# Altium footprint library connectors_socets.pcblib: 601 footprints (part 8 of 38)
Each footprint in its own frame and in the unit in brackets; x right, y up, seen from the top. Pads: shape width x height; smd on the part's side, far side on the other; paste and mask are expansions set on the pad; w line width, h text height; cw(c..) or ccw(c..) is an arc to the next point about the centre after c.
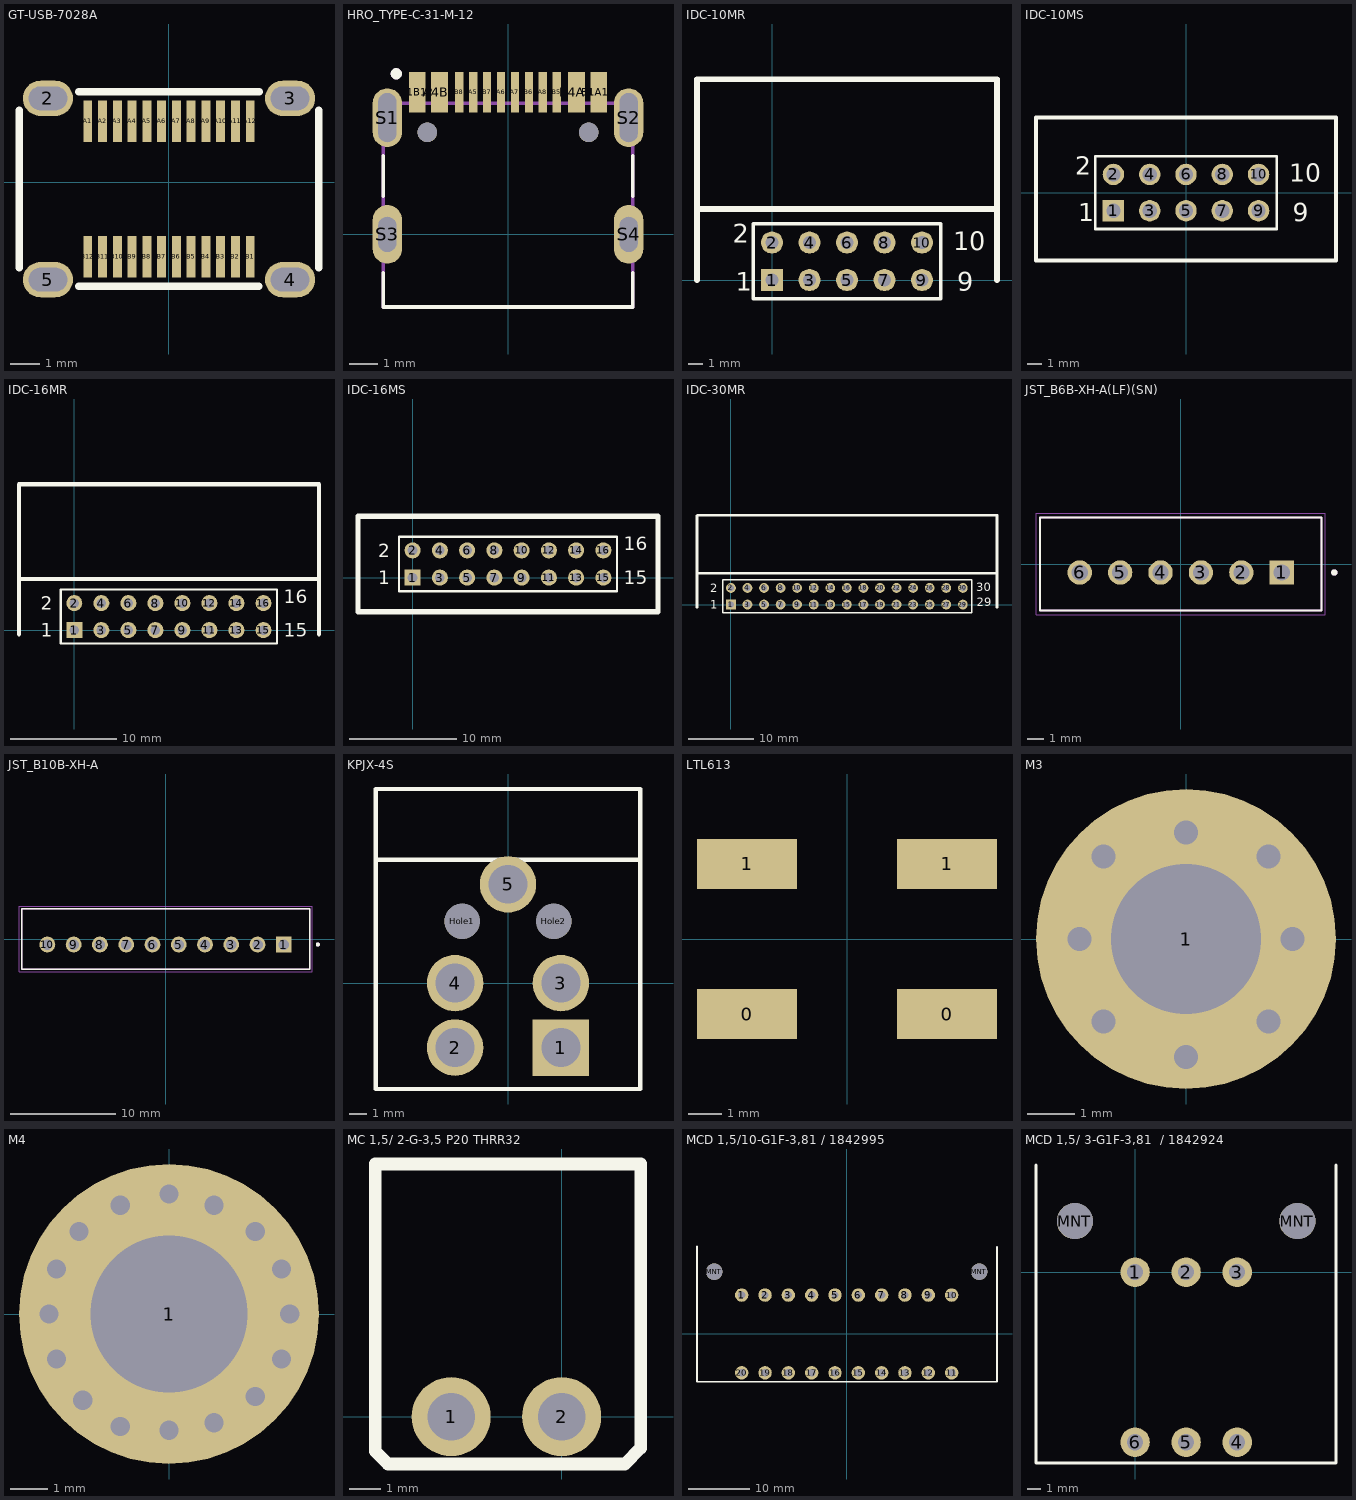
[diagram p7: the footprints below, top view; thin cyan lines are the x and y axes]

## GT-USB-7028A [mm] "USB C Vertical"
pads (28):
  oval 1.7x1.2 hole 0.8 slot 1.3 at 0 deg paste-2539.97 mask+0.05: 2(-4.1,2.84) 3(4.1,2.84) 4(4.1,-3.3) 5(-4.1,-3.3)
  rect 0.3x1.4 smd paste-100 mask+0.05: A1(-2.75,2.07) A2(-2.25,2.07) A3(-1.75,2.07) A4(-1.25,2.07) A5(-0.75,2.07) A6(-0.25,2.07) A7(0.25,2.07) A8(0.75,2.07) A9(1.25,2.07) A10(1.75,2.07) A11(2.25,2.07) A12(2.75,2.07) B1(2.75,-2.53) B2(2.25,-2.53) B3(1.75,-2.53) B4(1.25,-2.53) B5(0.75,-2.53) B6(0.25,-2.53) B7(-0.25,-2.53) B8(-0.75,-2.53) B9(-1.25,-2.53) B10(-1.75,-2.53) B11(-2.25,-2.53) B12(-2.75,-2.53)
Top Overlay:
  lines w0.254: -5.08,-2.897 -5.08,2.437 ; -3.052,-3.532 3.048,-3.532 ; -3.052,3.072 3.052,3.072 ; 5.08,-2.905 5.08,2.437
Top Paste:
  drawing of 28 lines, arcs and shapes, not listed
3D body "GT-USB-7028A.stp": height 12.06, standoff -1.64, extent -5.5,-3.725 5.5,3.275

## HRO_TYPE-C-31-M-12 [mm]
pads (18):
  rect 0.6x1.45 smd: A1B12(-3.25,5.095) A4B9(-2.45,5.095) B1A12(3.25,5.095) B4A9(2.45,5.095)
  rect 0.3x1.45 smd: A5(-1.25,5.095) A6(-0.25,5.095) A7(0.25,5.095) A8(1.25,5.095) B5(1.75,5.095) B6(0.75,5.095) B7(-0.75,5.095) B8(-1.75,5.095)
  oval 1.05x2.1 hole 0.65 slot 1.75 at 90 deg: S1(-4.32,4.18) S2(4.32,4.18)
  oval 1.05x2.1 hole 0.65 slot 1.25 at 90 deg: S3(-4.32,0) S4(4.32,0)
  round 0.7 hole 0.7 unplated: ""(-2.89,3.65) ""(2.89,3.65)
Top Overlay:
  circle w0.2: c-4,5.75 r0.1
  lines w0.127: -4.47,-1.37 -4.47,-2.6 4.47,-2.6 4.47,-1.37 ; -4.47,1.37 -4.47,2.81 ; 4.47,1.37 4.47,2.81
Plata3D:
  circle w0.2: c-4,5.75 r0.1
  lines w0.127: -4.47,-2.6 -4.47,4.7 4.47,4.7 4.47,-2.6 -4.47,-2.6
3D body "TYPE-C-31-M-12--3DModel-STEP-56544.STEP": height 3.31, standoff -0.99, extent -4.47,-2.6 4.47,5.305

## IDC-10MR [mm] "Connector; Header; 5x2 Position"
height 5
pads (10):
  rect 1.5x1.5 hole 0.9: 1(0,0)
  round 1.5 hole 0.9: 2(0,2.54) 3(2.54,0) 4(2.54,2.54) 5(5.08,0) 6(5.08,2.54) 7(7.62,0) 8(7.62,2.54) 9(10.16,0) 10(10.16,2.54)
Top Overlay:
  lines w0.254: -5.08,0 -5.08,4.8 ; -1.27,-1.27 -1.27,3.81 11.43,3.81 11.43,-1.27 -1.27,-1.27
  lines w0.4: -5.08,0 -5.08,13.6 15.24,13.6 15.24,6.35 15.24,4.8 -5.08,4.8 ; 15.24,0 15.24,5.08
  text "10" at 12.29,2.012 h1.27
  text "9" at 12.54,-0.738 h1.27
  text "2" at -2.67,2.52 h1.27
  text "1" at -2.46,-0.738 h1.27
3D body "User Library-BH10R-1.STEP": height 9.4, standoff -2.35, extent -5.069,-0.33 15.331,13.55

## IDC-10MS [mm] "Connector; Header; 5x2 Position"
pads (10):
  rect 1.5x1.5 hole 1: 1(-5.08,-1.27)
  round 1.5 hole 1: 2(-5.08,1.27) 3(-2.54,-1.27) 4(-2.54,1.27) 5(0,-1.27) 6(0,1.27) 7(2.54,-1.27) 8(2.54,1.27) 9(5.08,-1.27) 10(5.08,1.27)
Top Overlay:
  lines w0.2: -6.35,-2.54 6.35,-2.54 6.35,2.54 -6.35,2.54 -6.35,-2.54
  lines w0.3: -10.5,-4.75 -10.5,0 -10.5,5.25 10.5,5.25 10.5,-4.75 -10.5,-4.75
  text "1" at -7.54,-2.008 h1.27
  text "2" at -7.75,1.25 h1.27
  text "9" at 7.46,-2.008 h1.27
  text "10" at 7.21,0.742 h1.27
3D body "User Library-IDC-10MS.STEP": height 9.45, standoff -3.25, extent -10.2,-4.394 10.2,4.956

## IDC-16MR [mm]
pads (16):
  rect 1.5x1.5 hole 0.9: 1(0,0)
  round 1.5 hole 0.9: 2(0,2.54) 3(2.54,0) 4(2.54,2.54) 5(5.08,0) 6(5.08,2.54) 7(7.62,0) 8(7.62,2.54) 9(10.16,0) 10(10.16,2.54) 11(12.7,0) 12(12.7,2.54) 13(15.24,0) 14(15.24,2.54) 15(17.78,0) 16(17.78,2.54)
Top Overlay:
  lines w0.2: -1.27,-1.27 -1.27,3.81 19.05,3.81 19.05,-1.27 -1.27,-1.27
  lines w0.4: -5.2,-0.4 -5.2,13.7 23,13.7 23,-0.4 ; -5.1,4.8 22.9,4.8
  text "2" at -3.175,1.905 h1.27
  text "1" at -3.175,-0.635 h1.27
  text "15" at 19.685,-0.635 h1.27
  text "16" at 19.685,2.54 h1.27
3D body "User Library-DS1013-16R (IDC-16R CONNFLY).step": height 8.95, standoff -2.95, extent -5.17,-0.32 22.95,13.7

## IDC-16MS [mm]
pads (16):
  rect 1.5x1.5 hole 0.9: 1(0,0)
  round 1.5 hole 0.9: 2(0,2.54) 3(2.54,0) 4(2.54,2.54) 5(5.08,0) 6(5.08,2.54) 7(7.62,0) 8(7.62,2.54) 9(10.16,0) 10(10.16,2.54) 11(12.7,0) 12(12.7,2.54) 13(15.24,0) 14(15.24,2.54) 15(17.78,0) 16(17.78,2.54)
Top Overlay:
  lines w0.2: -1.27,-1.27 -1.27,3.81 19.05,3.81 19.05,-1.27 -1.27,-1.27
  lines w0.5: -5.08,-3.175 -5.08,5.715 22.86,5.715 22.86,-3.175 -5.08,-3.175
  text "2" at -3.175,1.905 h1.27
  text "1" at -3.175,-0.635 h1.27
  text "15" at 19.685,-0.635 h1.27
  text "16" at 19.685,2.54 h1.27
3D body "User Library-User Library-IDC-16M.STEP": height 9.3, standoff -3.1, extent -5.11,-3.175 22.89,5.925

## IDC-30MR [mm]
pads (30):
  rect 1.5x1.5 hole 0.9: 1(0,0)
  round 1.5 hole 0.9: 2(0,2.54) 3(2.54,0) 4(2.54,2.54) 5(5.08,0) 6(5.08,2.54) 7(7.62,0) 8(7.62,2.54) 9(10.16,0) 10(10.16,2.54) 11(12.7,0) 12(12.7,2.54) 13(15.24,0) 14(15.24,2.54) 15(17.78,0) 16(17.78,2.54) 17(20.32,0) 18(20.32,2.54) 19(22.86,0) 20(22.86,2.54) 21(25.4,0) 22(25.4,2.54) 23(27.94,0) 24(27.94,2.54) 25(30.48,0) 26(30.48,2.54) 27(33.02,0) 28(33.02,2.54) 29(35.56,0) 30(35.56,2.54)
Top Overlay:
  lines w0.2: -1.27,-1.27 36.9,-1.27 36.9,3.81 -1.27,3.81 -1.27,-1.27
  lines w0.4: -5.2,-0.4 -5.2,13.6 ; -5.2,4.8 40.8,4.8 ; -5.1,13.7 40.8,13.7 40.8,-0.4
  text "30" at 37.6,2 h1.27
  text "29" at 37.7,-0.3 h1.27
  text "1" at -3.175,-0.635 h1.27
  text "2" at -3.175,1.905 h1.27
3D body "User Library-DS1013-30R (IDC-30R CONNFLY).step": height 8.95, standoff -2.95, extent -5.17,-0.32 40.73,13.7

## JST_B6B-XH-A(LF)(SN) [mm]
height 7
pads (6):
  rect 1.508x1.508 / inner round 1.508 / far side rect 1.508x1.508 hole 1: 1(6.25,-0.525)
  round 1.508 hole 1: 2(3.75,-0.525) 3(1.25,-0.525) 4(-1.25,-0.525) 5(-3.75,-0.525) 6(-6.25,-0.525)
Top Overlay:
  circle w0.2: c9.5,-0.525 r0.1
  lines w0.127: -8.7,-2.875 8.7,-2.875 8.7,2.875 -8.7,2.875 -8.7,-2.875
Plata3D:
  circle w0.2: c9.5,-0.525 r0.1
  lines w0.127: -8.7,-2.875 8.7,-2.875 8.7,2.875 -8.7,2.875 -8.7,-2.875
Board3D:
  lines w0.05: -8.95,-3.125 8.95,-3.125 8.95,3.125 -8.95,3.125 -8.95,-3.125
3D body "step_temp.STEP": height 7, standoff -3.4, extent -8.7,-2.875 8.7,2.875

## JST_B10B-XH-A [mm]
height 7
pads (10):
  rect 1.508x1.508 / inner round 1.508 / far side rect 1.508x1.508 hole 1: 1(11.25,-0.525)
  round 1.508 hole 1: 2(8.75,-0.525) 3(6.25,-0.525) 4(3.75,-0.525) 5(1.25,-0.525) 6(-1.25,-0.525) 7(-3.75,-0.525) 8(-6.25,-0.525) 9(-8.75,-0.525) 10(-11.25,-0.525)
Top Overlay:
  circle w0.2: c14.5,-0.525 r0.1
  lines w0.127: -13.7,-2.875 -13.7,2.875 13.7,2.875 13.7,-2.875 -13.7,-2.875
Plata3D:
  circle w0.2: c14.5,-0.525 r0.1
  lines w0.127: -13.7,-2.875 -13.7,2.875 13.7,2.875 13.7,-2.875 -13.7,-2.875
Board3D:
  lines w0.05: -13.95,-3.125 -13.95,3.125 13.95,3.125 13.95,-3.125 -13.95,-3.125
3D body "User Library-B10B-XH-A.STEP": height 7, standoff -3.4, extent -13.7,-2.875 13.7,2.875

## KPJX-4S [mm]
height 15
pads (7):
  rect 3.2x3.2 hole 2.2: 1(3,-3.65)
  round 3.2 hole 2.2: 2(-3,-3.65) 3(3,0) 4(-3,0) 5(0,5.6)
  round 2 hole 2: Hole1(-2.6,3.5) Hole2(2.6,3.5)
Top Overlay:
  lines w0.254: -7.5,7 -7.5,11 7.5,11 7.5,7 ; -7.5,7 -7.5,-6 7.5,-6 7.5,7 ; -7.5,7 7.5,7
3D body "KPJX-4S.stp": height 15, standoff 0, extent -8,-6.5 8,11

## LTL613 [mm]
pads (4):
  rect 3x1.5 smd: 0(-3,-2.25) 0(3,-2.25) 1(-3,2.25) 1(3,2.25)
3D body "LTL613.stp": height 5, standoff 0, extent -4.039,-3 4.039,3

## M3 [mm]
pads (1):
  round 6.35 hole 3.175: 1(0,0)
via -2.25,0 diameter 0.889 hole 0.508
via 2.25,0 diameter 0.889 hole 0.508
via 0,2.25 diameter 0.889 hole 0.508
via 0,-2.5 diameter 0.889 hole 0.508
via 1.75,1.75 diameter 0.889 hole 0.508
via -1.75,1.75 diameter 0.889 hole 0.508
via -1.75,-1.75 diameter 0.889 hole 0.508
via 1.75,-1.75 diameter 0.889 hole 0.508

## M4 [mm]
pads (1):
  round 8 hole 4.2: 1(0,0)
via 2.3,-2.2 diameter 0.889 hole 0.508
via -2.3,-2.3 diameter 0.889 hole 0.508
via -2.4,2.2 diameter 0.889 hole 0.508
via 2.3,2.2 diameter 0.889 hole 0.508
via 0,-3.1 diameter 0.889 hole 0.508
via 0,3.2 diameter 0.889 hole 0.508
via 3.22,0 diameter 0.889 hole 0.508
via -3.2,0 diameter 0.889 hole 0.508
via 1.2,-2.9 diameter 0.889 hole 0.508
via 3,-1.2 diameter 0.889 hole 0.508
via 3,1.2 diameter 0.889 hole 0.508
via 1.2,2.9 diameter 0.889 hole 0.508
via -1.3,2.9 diameter 0.889 hole 0.508
via -3,1.2 diameter 0.889 hole 0.508
via -3,-1.2 diameter 0.889 hole 0.508
via -1.3,-3 diameter 0.889 hole 0.508

## MC 1,5/ 2-G-3,5 P20 THRR32 [mm]
pads (2):
  round 2.5 hole 1.5: 1(-3.5,0) 2(0,0)
Top Overlay:
  lines w0.4: -5.9,-1.1 -5.5,-1.5 2,-1.5 2.5,-1 2.5,8 -5.9,8 -5.9,-1.1
3D body "pxc_1788738_01_MC-1-5-2-G-3-5-P20-THRR32_3D.stp": height 7, standoff -1.9, extent -5.89,-1.2 2.5,8

## MCD 1,5/10-G1F-3,81 / 1842995 [mm]
pads (22):
  round 2.2 hole 1.2: 1(-17.145,6.35) 2(-13.335,6.35) 3(-9.525,6.35) 4(-5.715,6.35) 5(-1.905,6.35) 6(1.905,6.35) 7(5.715,6.35) 8(9.525,6.35) 9(13.335,6.35) 10(17.145,6.35) 11(17.145,-6.35) 12(13.335,-6.35) 13(9.525,-6.35) 14(5.715,-6.35) 15(1.905,-6.35) 16(-1.905,-6.35) 17(-5.715,-6.35) 18(-9.525,-6.35) 19(-13.335,-6.35) 20(-17.145,-6.35)
  round 2.7 hole 2.7 unplated: MNT(-21.645,10.16) MNT(21.645,10.16)
Top Overlay:
  lines w0.254: -24.445,14.35 -24.445,-7.85 24.555,-7.85 24.555,14.25
3D body "pxc_1842995_03_MCD-1-5-10-G1F-3-81_3D.stp": height 22.75, standoff -3.45, extent -24.235,-7.55 24.255,14.35

## MCD 1,5/ 3-G1F-3,81  / 1842924 [mm]
pads (8):
  round 2.2 hole 1.2: 1(0,0) 2(3.81,0) 3(7.62,0) 4(7.62,-12.7) 5(3.81,-12.7) 6(0,-12.7)
  round 2.7 hole 2.7 unplated: MNT(-4.5,3.81) MNT(12.12,3.81)
Top Overlay:
  lines w0.254: -7.4,8 -7.4,-14.25 3.6,-14.25 ; 3.2,-14.25 15,-14.25 15,8
3D body "pxc_1842924_03_MCD-1-5-3-G1F-3-81_3D.stp": height 22.75, standoff -3.45, extent -7.1,-13.9 14.72,8